# Altium footprint library vmorais_libraries.PcbLib: 95 footprints (part 2 of 6)
Each footprint in its own frame and in the unit in brackets; x right, y up, seen from the top. Pads: shape width x height; smd on the part's side, far side on the other; paste and mask are expansions set on the pad; w line width, h text height; cw(c..) or ccw(c..) is an arc to the next point about the centre after c.
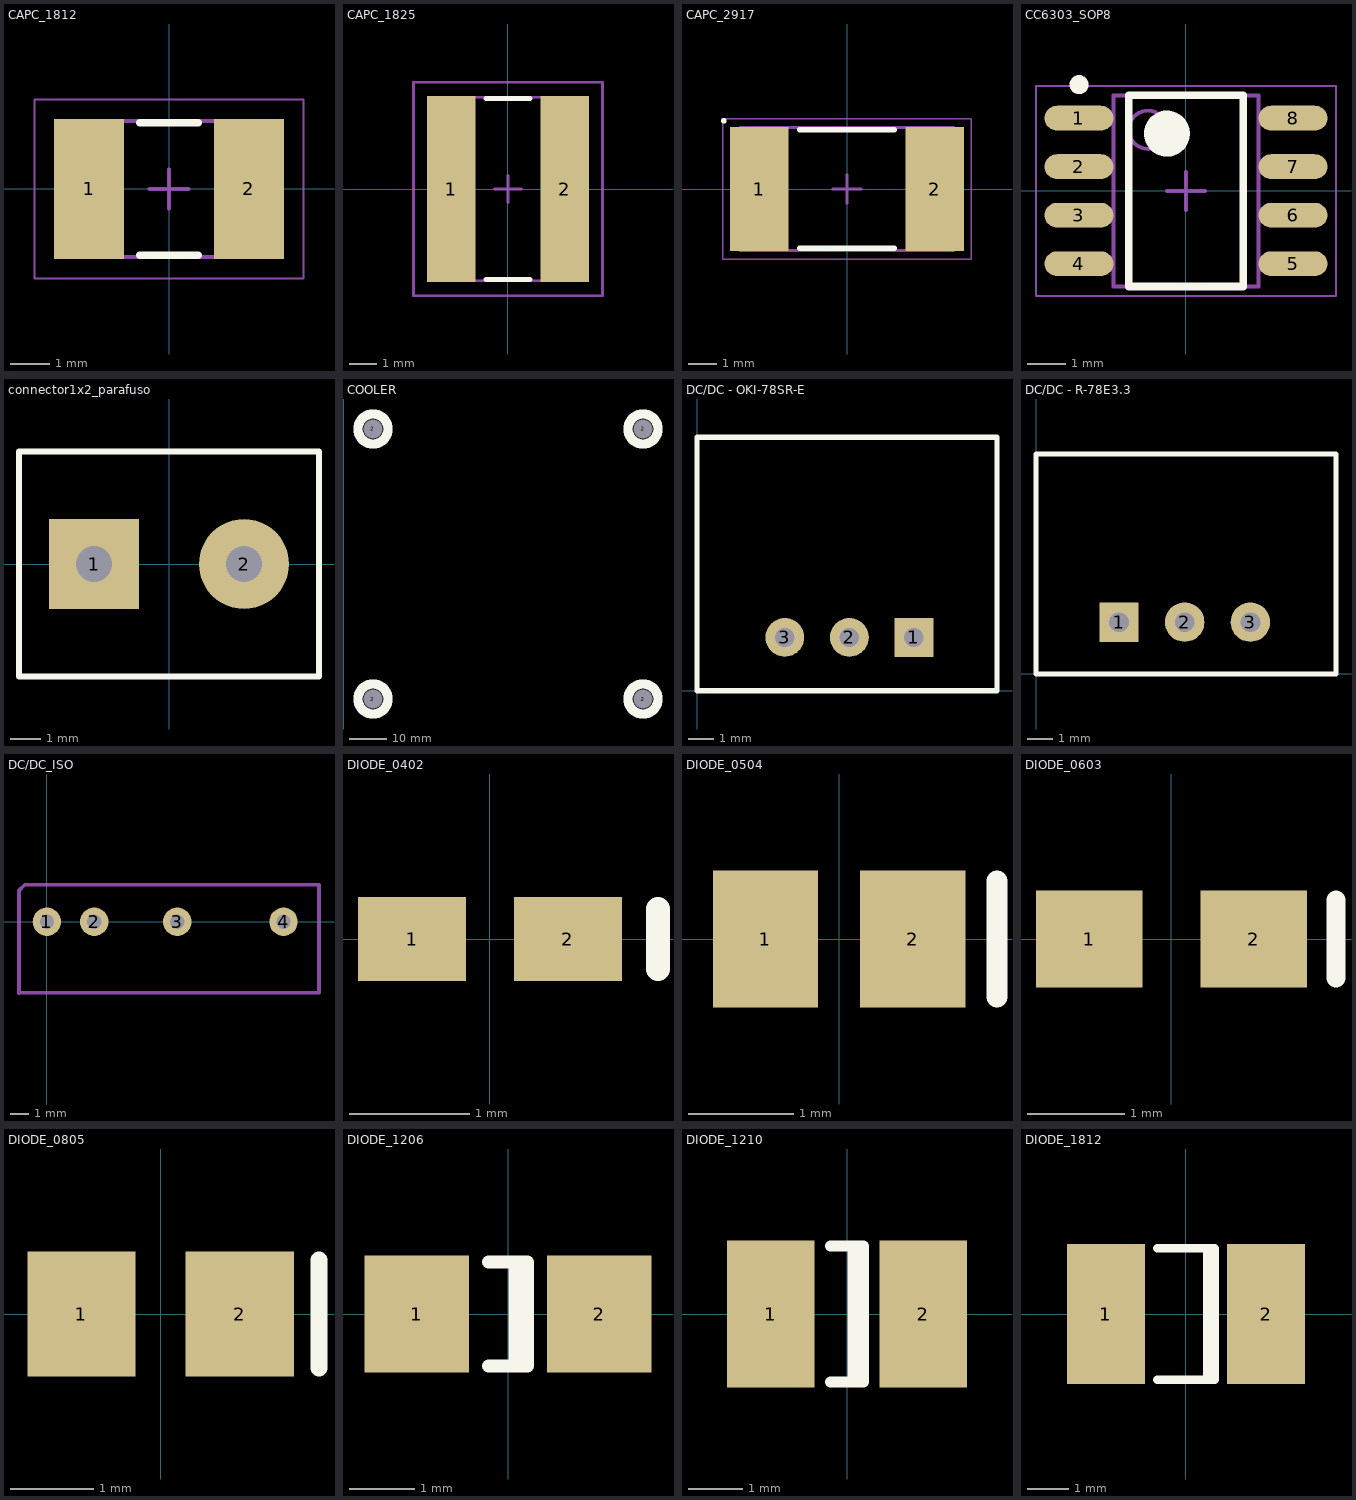
[diagram p1: the footprints below, top view; thin cyan lines are the x and y axes]

## CAPC_1812 [mm] "Chip Capacitor, 2-Leads, Body 4,50x3,20mm, IPC Low Density"
height 2.6
pads (2):
  rect 1.8x3.6 smd: 1(-2.05,0) 2(2.05,0)
Top Overlay:
  lines w0.2: -0.75,-1.7 0.75,-1.7 ; -0.75,1.7 0.75,1.7
Mechanical 13:
  lines w0.1: -2.4,-1.75 -2.4,1.75 2.4,1.75 2.4,-1.75 -2.4,-1.75
Mechanical 15:
  lines w0.05: -3.45,-2.3 -3.45,2.3 3.45,2.3 3.45,-2.3 -3.45,-2.3
  lines w0.1: -0.5,0 0.5,0 ; 0,-0.5 0,0.5
3D body "CAPC4532X26M.step": height 2.6, standoff 0, extent -2.4,-1.75 2.4,1.75

## CAPC_1825 [mm] "Chip Capacitor, Body 4.5x6.4mm, IPC Low Density"
height 1.1
pads (2):
  rect 1.8x6.9 smd: 1(-2.1,0) 2(2.1,0)
Top Overlay:
  lines w0.2: -0.8,-3.35 0.8,-3.35 ; -0.8,3.35 0.8,3.35
Mechanical 13:
  lines w0.1: -2.4,-3.4 2.4,-3.4 2.4,3.4 -2.4,3.4 -2.4,-3.4
Mechanical 15:
  lines w0.1: -0.5,0 0.5,0 ; 0,-0.5 0,0.5 ; -3.5,-3.95 3.5,-3.95 3.5,3.95 -3.5,3.95 -3.5,-3.95
3D body: height 1.1, standoff 0, extent -2.4,-3.4 2.4,3.4

## CAPC_2917 [mm] "Chip Capacitor, 2-Leads, Body 7,30x4,20mm, IPC Medium Density"
height 4
pads (2):
  rect 2.05x4.35 smd: 1(-3.075,0) 2(3.075,0)
Top Overlay:
  circle w0.1: c-4.312,2.387 r0.05
  lines w0.2: -1.65,-2.075 1.65,-2.075 ; -1.65,2.075 1.65,2.075
Mechanical 13:
  lines w0.1: -3.75,-2.15 -3.75,2.15 3.75,2.15 3.75,-2.15 -3.75,-2.15
Mechanical 15:
  lines w0.05: -4.35,-2.45 -4.35,2.45 4.35,2.45 4.35,-2.45 -4.35,-2.45
  lines w0.1: -0.5,0 0.5,0 ; 0,-0.5 0,0.5
3D body: height 4, standoff 0, extent -2.45,-2.15 2.45,2.15
3D body: height 4, standoff 0, extent -3.75,-2.15 -2.45,2.15
3D body: height 4, standoff 0, extent 2.45,-2.15 3.75,2.15

## CC6303_SOP8 [mm] "SOP, 8-Leads, Body 4,90x3,91mm, Pitch 1,27mm, IPC Medium Density"
height 2.65
pads (8):
  oval 1.8x0.65 smd: 1(-2.8,1.905) 2(-2.8,0.635) 3(-2.8,-0.635) 4(-2.8,-1.905) 5(2.8,-1.905) 6(2.8,-0.635) 7(2.8,0.635) 8(2.8,1.905)
Top Overlay:
  circle w0.6: c-0.5,1.5 r0.3
  circle w0.25: c-2.8,2.78 r0.125
  lines w0.2: -1.5,-2.5 1.5,-2.5 1.5,2.5 -1.5,2.5 -1.5,-2.5
Mechanical 13:
  circle w0.1: c-1,1.6 r0.5
  lines w0.1: -1.9,-2.5 1.9,-2.5 1.9,2.5 -1.9,2.5 -1.9,-2.5
Mechanical 15:
  lines w0.05: -3.925,-2.75 3.925,-2.75 3.925,2.75 -3.925,2.75 -3.925,-2.75
  lines w0.1: -0.5,0 0.5,0 ; 0,-0.5 0,0.5
3D body: height 2.65, standoff 0.1, extent -1.9,-2.5 1.9,2.5

## connector1x2_parafuso [mm] "Connector; Header; 2 Position"
pads (2):
  rect 3x3 hole 1.2: 1(-2.5,0)
  round 3 hole 1.2: 2(2.5,0)
Top Overlay:
  lines w0.2: -5,-3.75 5,-3.75 5,3.75 -5,3.75 -5,-3.75
3D body "SCREW TERMINAL BLOCK 5MM.STP": height 14.6, standoff -2.3, extent -4.919,-4.53 5.681,4.47

## COOLER [mm]
pads (4):
  round 2 hole 5: 2(7.863,-90.048) 2(7.863,-18.048) 2(79.863,-90.048) 2(79.863,-18.048)
Top Overlay:
  circle w2.5: c79.863,-18.048 r4
  circle w2.5: c7.863,-18.048 r4
  circle w2.5: c79.863,-90.048 r4
  circle w2.5: c7.863,-90.048 r4
Bottom Overlay:
  circle w2.5: c7.863,-18.048 r4
  circle w2.5: c7.863,-90.048 r4
  circle w2.5: c79.863,-90.048 r4
  circle w2.5: c79.863,-18.048 r4
3D body "7030028_ASSY_CPU HEATSINK.stp": height 142, standoff 2.35, extent -0.004,-106.398 86.996,-0.013

## DC/DC - OKI-78SR-E [mil]
pads (3):
  rect 60x60 hole 30: 1(336.22,82.68)
  round 60 hole 30: 2(236.22,82.68) 3(136.22,82.68)
Top Overlay:
  lines w7.87: 0,0 465,0 465,393 0,393 0,0
3D body: height 692.91, standoff 3.94, extent 8,8 456,385

## DC/DC - R-78E3.3 [mil]
pads (3):
  rect 60x60 hole 30: 1(126.38,78.74)
  round 60 hole 30: 2(226.38,78.74) 3(326.38,78.74)
Top Overlay:
  lines w7.87: 0,0 0,334.65 456.69,334.65 456.69,0 0,0
3D body: height 401.57, standoff 3.94, extent 8,8 447,325

## DC/DC_ISO [mil]
pads (4):
  round 60 hole 30: 1(0,0) 2(100,0) 3(275.59,0) 4(500,0)
Mechanical 13:
  lines w7.87: -59,-151 -59,66 -47,78 575,78 575,-150 -58,-150 -59,-151
3D body: height 314.96, standoff 39.37, extent -53.75,-149 572,80

## DIODE_0402 [mm] "Chip Diode; Body 1.0 x 0.5 mm (LxW typ)"
height 0.6
pads (2):
  rect 0.9x0.7 smd: 1(-0.65,0) 2(0.65,0)
Top Overlay:
  lines w0.2: 1.4,-0.25 1.4,0.25

## DIODE_0504 [mm] "Chip Diode; Body 1.2 x 1.0 mm (LxW typ)"
height 1.02
pads (2):
  rect 1x1.3 smd: 1(-0.7,0) 2(0.7,0)
Top Overlay:
  lines w0.2: 1.5,-0.55 1.5,0.55

## DIODE_0603 [mm] "Chip Diode; Body 1.6 x 0.8 mm (LxW typ)"
height 0.85
pads (2):
  rect 1.1x1 smd: 1(-0.85,0) 2(0.85,0)
Top Overlay:
  lines w0.2: 1.7,-0.4 1.7,0.4

## DIODE_0805 [mm] "Chip Diode; Body 2.0 x 1.3 mm (LxW typ)"
height 1.1
pads (2):
  rect 1.3x1.5 smd: 1(-0.95,0) 2(0.95,0)
Top Overlay:
  lines w0.2: 1.9,-0.65 1.9,0.65

## DIODE_1206 [mm] "Chip Diode; Body 3.2 x 1.6 mm (LxW typ)"
height 1.35
pads (2):
  rect 1.6x1.8 smd: 1(-1.4,0) 2(1.4,0)
Top Overlay:
  lines w0.2: -0.3,-0.8 0.3,-0.8 0.3,0.8 -0.3,0.8 ; 0.11,-0.8 0.11,0.8

## DIODE_1210 [mm] "Chip Diode; Body 3.2 x 2.5 mm (LxW typ)"
height 1.35
pads (2):
  rect 1.6x2.7 smd: 1(-1.4,0) 2(1.4,0)
Top Overlay:
  lines w0.2: -0.3,-1.25 0.3,-1.25 0.3,1.25 -0.3,1.25 ; 0.11,-1.25 0.11,1.25

## DIODE_1812 [mm] "Chip Diode; Body 4.5 x 3.2 mm (LxW typ)"
height 1.35
pads (2):
  rect 1.9x3.4 smd: 1(-1.95,0) 2(1.95,0)
Top Overlay:
  lines w0.2: -0.7,-1.6 0.7,-1.6 0.7,1.6 -0.7,1.6 ; 0.51,-1.6 0.51,1.6